# Altium footprint library kalios.PcbLib: 404 footprints (part 14 of 26)
Each footprint in its own frame and in the unit in brackets; x right, y up, seen from the top. Pads: shape width x height; smd on the part's side, far side on the other; paste and mask are expansions set on the pad; w line width, h text height; cw(c..) or ccw(c..) is an arc to the next point about the centre after c.
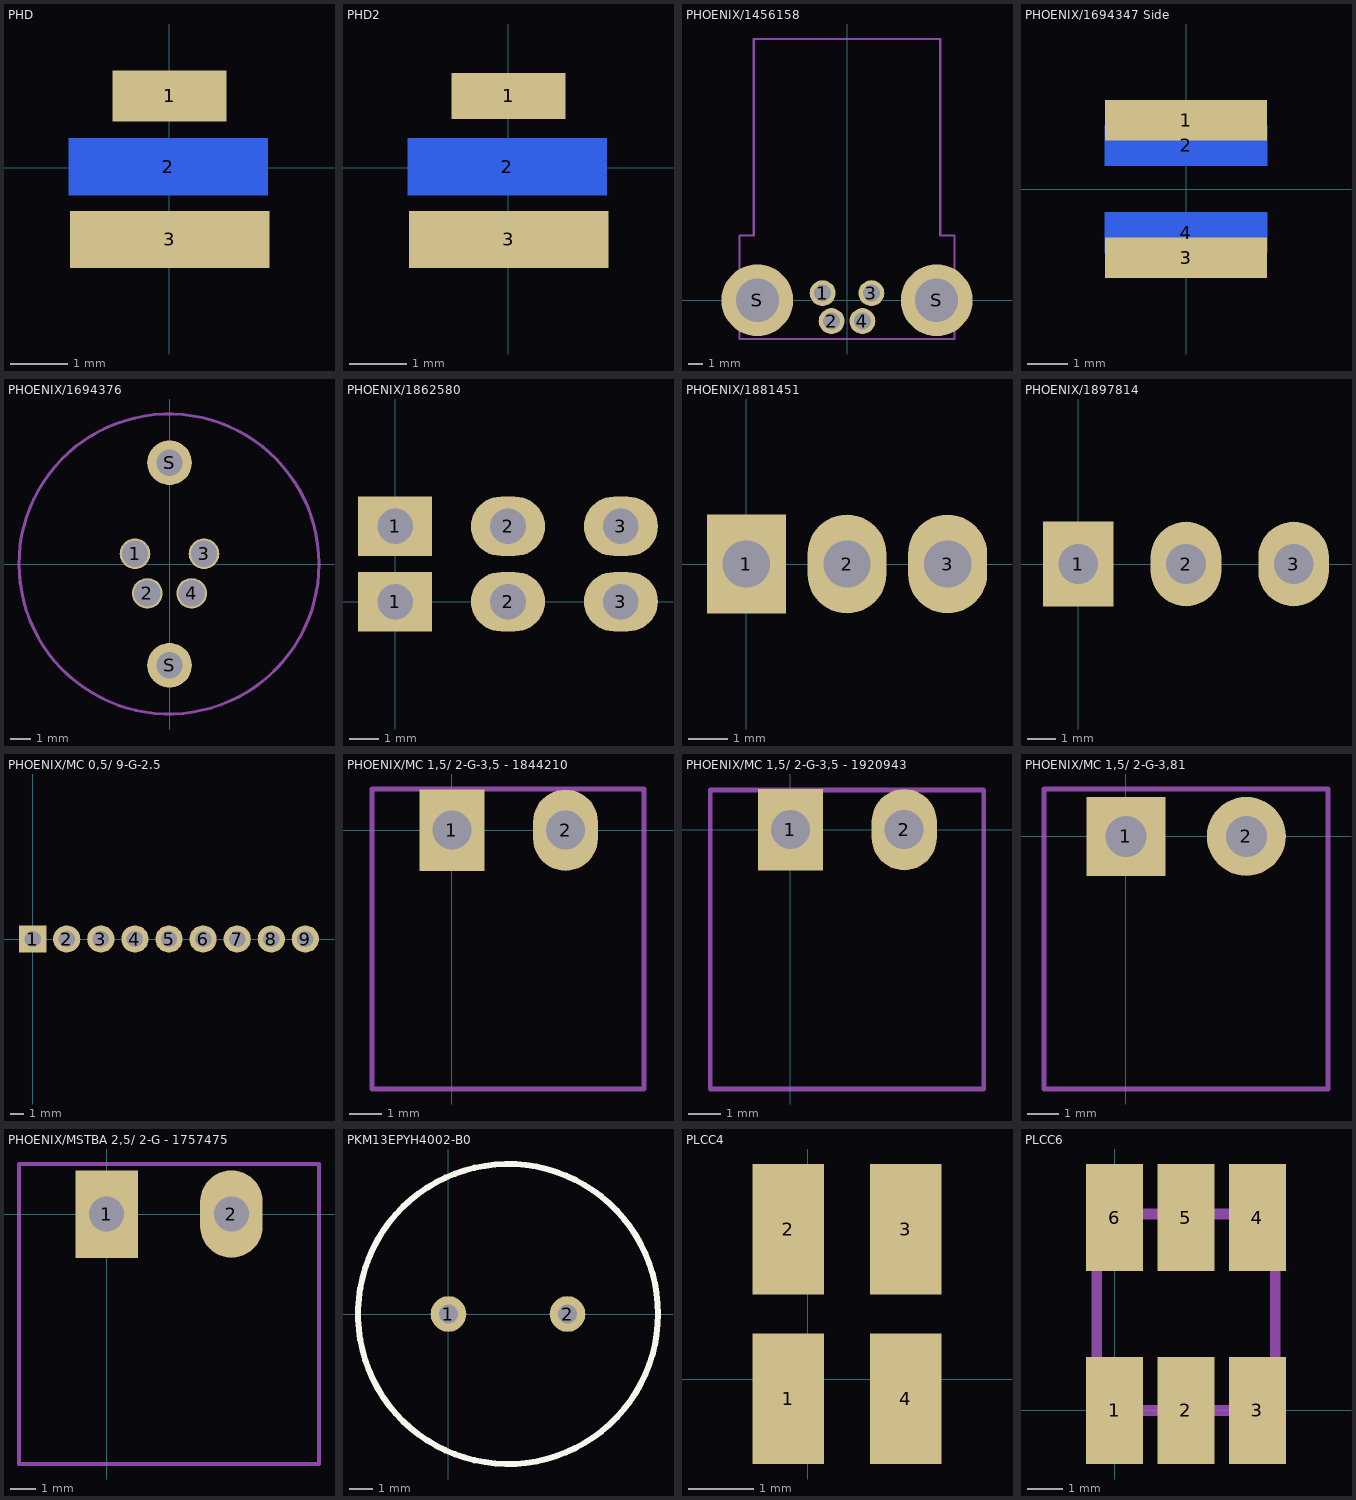
[diagram p13: the footprints below, top view; thin cyan lines are the x and y axes]

## PHD [mm]
pads (3):
  rect 2x0.9 smd: 1(0.013,1.257)
  rect 3.5x1 smd far side: 2(-0.013,0.013)
  rect 3.5x1 smd: 3(0.013,-1.257)
Top Designator:
  text ".Designator" at -13.657,-0.508 h1.52
3D body "PHD.STEP": height 3.51, standoff -2.99, extent -13.943,-3.25 0.507,3.25

## PHD2 [mm]
pads (3):
  rect 2x0.8 smd: 1(0.013,1.257)
  rect 3.5x1 smd far side: 2(-0.013,0.013)
  rect 3.5x1 smd: 3(0.013,-1.257)
Top Designator:
  text ".Designator" at -9.527,-0.418 h1.52
3D body "S5971.STEP": height 3.25, standoff -2.43, extent -5.683,-2.75 0.717,2.929

## PHOENIX/1456158 [mm]
pads (6):
  round 1.8 hole 1.2: 1(-1.7,0.5) 2(-1.075,-1.45) 3(1.7,0.5) 4(1.075,-1.45)
  round 5 hole 3: S(-6.25,0) S(6.25,0)
Top Courtyard:
  lines w0.15: 0,-2.7 7.5,-2.7 7.5,4.5 6.5,4.5 6.5,18.2 -6.5,18.2 -6.5,4.5 -7.5,4.5 -7.5,-1.3 -7.5,-2.7 0.1,-2.7
Top Designator:
  text ".Designator" at -7.618,7.242 h1.52
3D body "1456158 Phoenix.STEP": height 12.55, standoff -3.5, extent -6.399,-1.947 6.401,18.203

## PHOENIX/1694347 Side [mm]
pads (4):
  rect 4x1 smd: 1(0,1.7) 3(0,-1.7)
  rect 4x1 smd far side: 2(0,1.075) 4(0,-1.075)
Top Designator:
  text ".Designator" at 0.979,-0.508 h1.52
3D body "1694347 Phoenix.STEP": height 5, standoff -5, extent -1.706,-5.75 19.294,5.75

## PHOENIX/1694376 [mm]
pads (10):
  round 0 / inner oval 1.7x4 / far side oval 1.7x4 hole 1.3 copper offset -0.849,0.849: 1(-1.702,0.508)
  oval 1.51x1.5 hole 1.3: 1(-1.702,0.508) 2(-1.092,-1.448) 3(1.702,0.508) 4(1.092,-1.448)
  round 0 / inner oval 1.7x4 / far side oval 1.7x4 hole 1.3 copper offset -0.849,-0.849: 2(-1.092,-1.448)
  round 0 / inner oval 1.7x4 / far side oval 1.7x4 hole 1.3 copper offset 0.849,0.849: 3(1.702,0.508)
  round 0 / inner oval 1.7x4 / far side oval 1.7x4 hole 1.3 copper offset 0.849,-0.849: 4(1.092,-1.448)
  round 2.2 hole 1.3: S(0,-5) S(0,5)
Top Courtyard:
  lines w0.15: 7.375,0 cw(c-0.025,0) 7.375,0.024
Top Designator:
  text ".Designator" at -7.623,-0.508 h1.52
3D body "1694376-2.STEP": height 14.5, standoff -2.5, extent -7.49,-7 7.49,7

## PHOENIX/1862580 [mm]
pads (6):
  rect 2.5x2 hole 1.2: 1(0,0) 1(0,2.54)
  oval 2.5x2 hole 1.2: 2(3.81,0) 2(3.81,2.54) 3(7.62,0) 3(7.62,2.54)
Top Designator:
  text ".Designator" at -3.808,4.888 h1.52
3D body "1862580.STEP": height 6.85, standoff -3.4, extent -2.3,-1.854 9.92,12.646

## PHOENIX/1881451 [mm]
pads (3):
  rect 2x2.5 hole 1.2: 1(0,0)
  oval 2x2.5 hole 1.2: 2(2.54,0) 3(5.08,0)
Top Designator:
  text ".Designator" at -5.118,-4.307 h1.52
3D body "1881451.STEP": height 8.1, standoff -3.5, extent -2.2,-8.95 7.2,1.15

## PHOENIX/1897814 [mm]
pads (3):
  rect 2.5x3 hole 1.4: 1(0,0)
  oval 2.5x3 hole 1.4: 2(3.81,0) 3(7.62,0)
Top Designator:
  text ".Designator" at -3.808,-4.1 h1.52
3D body "1897814.STEP": height 7, standoff -3.5, extent -2.6,-8.992 10.22,1.807

## PHOENIX/MC 0,5/ 9-G-2.5 [mm]
pads (9):
  rect 2x2 hole 1.2: 1(0,0)
  round 2 hole 1.2: 2(2.5,0) 3(5,0) 4(7.5,0) 5(10,0) 6(12.5,0) 7(15,0) 8(17.5,0) 9(20,0)
Top Designator:
  text ".Designator" at 2.398,-11.039 h1.52
3D body "as-mc_0.5-9-g-2.5.STEP": height 12.08, standoff -3.07, extent -2.184,-22.281 22.216,1.219

## PHOENIX/MC 1,5/ 2-G-3,5 - 1844210 [mm]
pads (2):
  rect 2x2.5 hole 1.2: 1(0,0)
  oval 2x2.5 hole 1.2: 2(3.5,0)
Top Courtyard:
  lines w0.15: -2.464,-7.976 5.918,-7.976 5.918,1.27 -2.464,1.27 -2.464,-7.976
Top Designator:
  text ".Designator" at -5.89,-3.857 h1.52
3D body "1844210.STEP": height 7.25, standoff -3.4, extent -2.451,-7.978 5.949,1.222

## PHOENIX/MC 1,5/ 2-G-3,5 - 1920943 [mm]
pads (2):
  rect 2x2.5 hole 1.2: 1(0,0)
  oval 2x2.5 hole 1.2: 2(3.5,0)
Top Courtyard:
  lines w0.15: -2.438,1.219 5.944,1.219 5.944,-7.976 -2.464,-7.976 -2.464,1.219 -2.388,1.219
Top Designator:
  text ".Designator" at -5.878,-3.857 h1.52
3D body "1920943.STEP": height 7.25, standoff -3.4, extent -2.451,-7.978 5.949,1.222

## PHOENIX/MC 1,5/ 2-G-3,81 [mm]
pads (2):
  rect 2.5x2.5 hole 1.3: 1(0,0)
  round 2.5 hole 1.3: 2(3.81,0)
Top Courtyard:
  lines w0.15: -2.6,-8 -2.6,1.5 6.4,1.5 6.4,-8 -2.6,-8
Top Designator:
  text ".Designator" at -5.718,-3.758 h1.52
3D body "1803277.STEP": height 7.25, standoff -3.4, extent -2.574,-8.006 6.436,1.194

## PHOENIX/MSTBA 2,5/ 2-G - 1757475 [mm]
pads (2):
  rect 2.5x3.5 hole 1.4: 1(0,0)
  oval 2.5x3.5 hole 1.4: 2(5,0)
Top Courtyard:
  lines w0.15: -3.5,-10 8.5,-10 8.5,2 -3.5,2 -3.5,-10
Top Designator:
  text ".Designator" at -5.118,-4.508 h1.52
3D body "1757475.STEP": height 8.6, standoff -3.5, extent -3.491,-9.988 8.509,2.012

## PKM13EPYH4002-B0 [mm]
pads (2):
  round 1.5 hole 0.8: 1(0,0) 2(5,0)
Top Overlay:
  circle w0.254: c2.5,0 r6.3
Top Designator:
  text ".Designator" at -5.118,-0.508 h1.52
3D body "PKM13EPYH4002.STEP": height 6.9, standoff -3.5, extent -3.759,-6.25 8.816,6.301

## PLCC4 [mm]
pads (4):
  rect 1.1x2 smd: 1(-0.3,-0.3) 2(-0.3,2.3) 3(1.5,2.3) 4(1.5,-0.3)
Top Designator:
  text ".Designator" at -7.018,0.492 h1.52
3D body "User Library-Osram_Led_PLCC4-2.STEP": height 1.95, standoff 0, extent -0.8,-0.75 2,2.75

## PLCC6 [mm]
pads (6):
  rect 1.6x3 smd: 1(0,0) 2(2,0) 3(4,0) 4(4,5.4) 5(2,5.4) 6(0,5.4)
Top Courtyard:
  lines w0.3: -0.5,1.3 0.7,0 ; -0.5,0 -0.5,5.5 4.5,5.5 4.5,0 -0.5,0
Top Designator:
  text ".Designator" at -5.618,2.192 h1.52